# Altium footprint library 集大电协1.5.PcbLib: 283 footprints (part 4 of 18)
Each footprint in its own frame and in the unit in brackets; x right, y up, seen from the top. Pads: shape width x height; smd on the part's side, far side on the other; paste and mask are expansions set on the pad; w line width, h text height; cw(c..) or ccw(c..) is an arc to the next point about the centre after c.
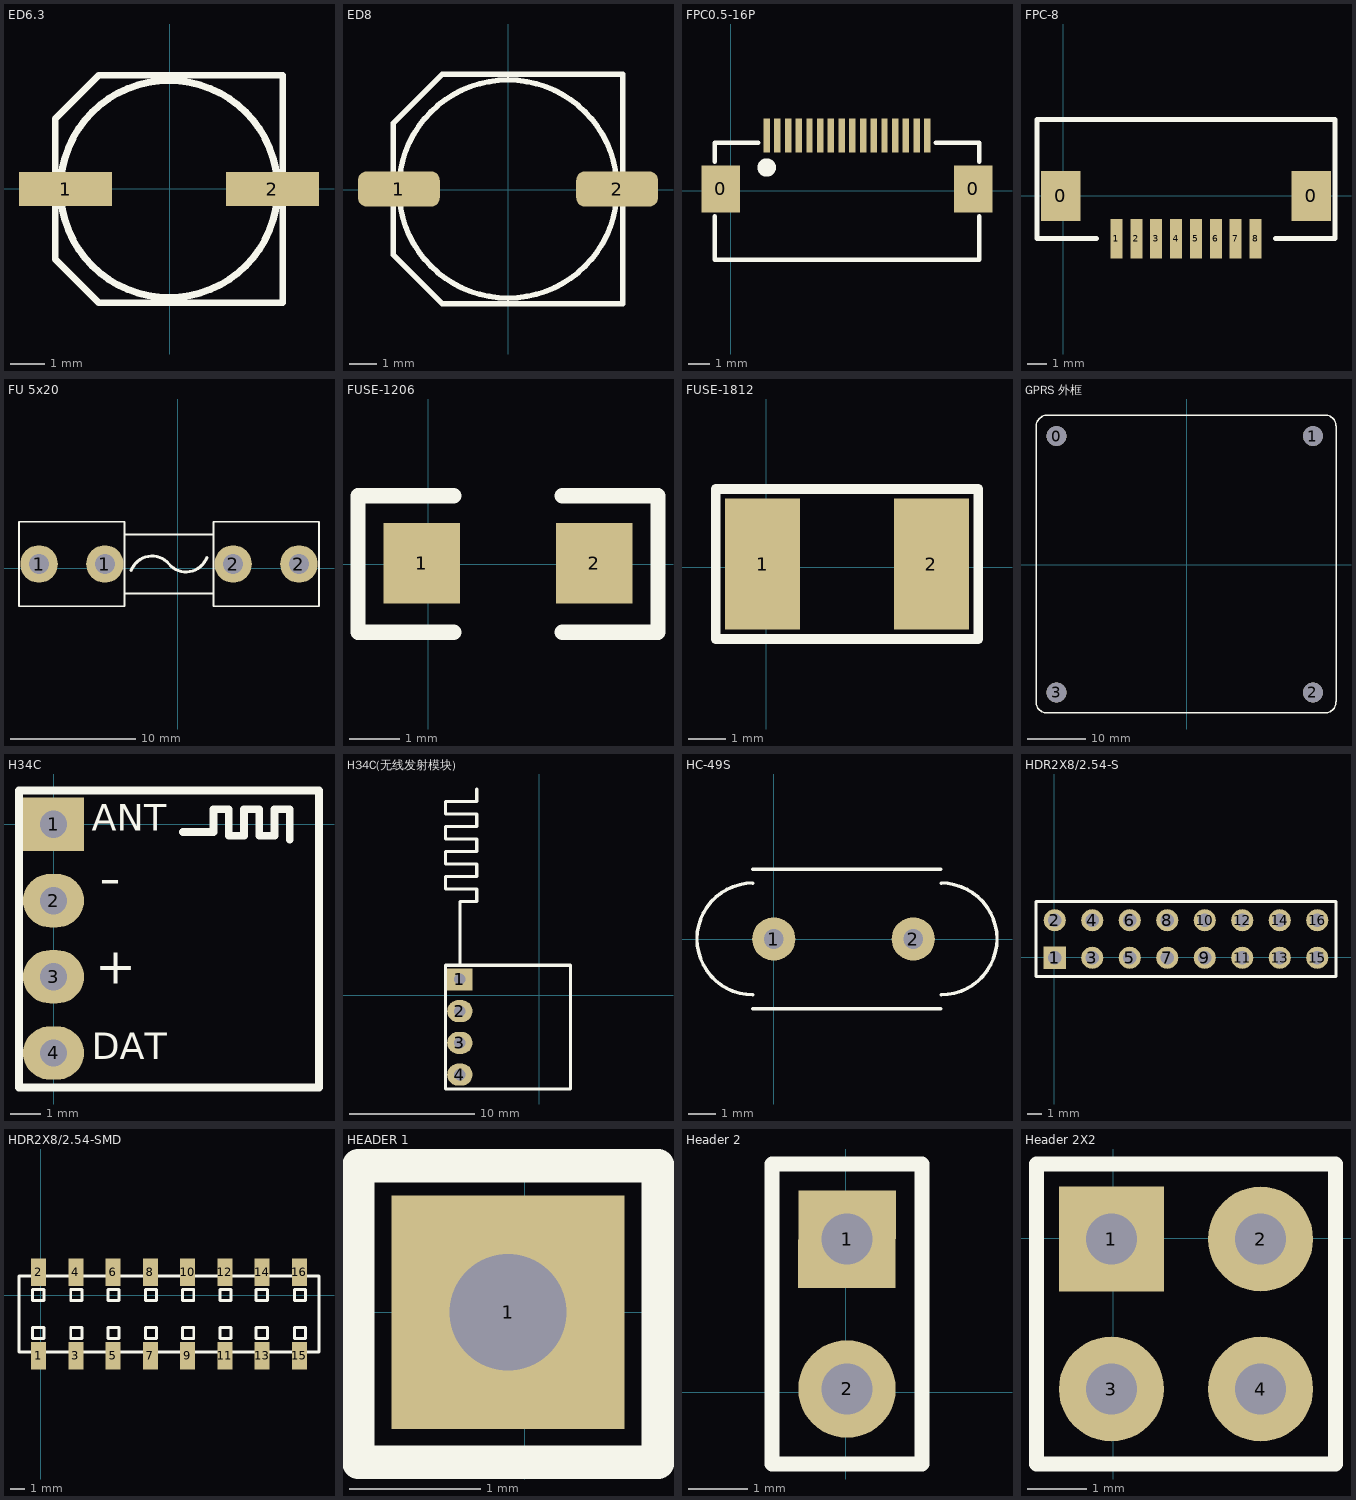
[diagram p3: the footprints below, top view; thin cyan lines are the x and y axes]

## ED6.3 [mm]
pads (2):
  rect 2.7x1 smd: 1(-3.015,-0.003) 2(2.985,-0.003)
Top Overlay:
  circle w0.2: c-0.015,-0.003 r3.15
  lines w0.2: -3.315,2.029 -3.315,-2.035 -2.047,-3.303 3.285,-3.303 3.285,3.297 -2.047,3.297 -3.303,2.042
3D body "SL-E.step": height 5.2, standoff 0, extent -3.515,-3.305 3.485,3.295

## ED8 [mm]
pads (2):
  rrect50% 3x1.3 smd: 1(-4.005,0.028) 2(3.995,0.028)
Top Overlay:
  circle w0.2: c-0.005,0.028 r4
  lines w0.2: -4.205,-2.385 -4.205,2.441 -2.418,4.228 4.195,4.228 4.195,-4.172 -2.418,-4.172 -4.205,-2.385
3D body "SL-H.step": height 10.5, standoff 0, extent -4.526,-4.188 4.474,4.112

## FPC0.5-16P [mm]
pads (18):
  rect 1.8x2.2 smd: 0(-0.47,0.08) 0(11.33,0.08)
  rect 0.3x1.6 smd: 1(1.68,2.577) 2(2.18,2.577) 3(2.68,2.577) 4(3.18,2.577) 5(3.68,2.577) 6(4.18,2.577) 7(4.68,2.577) 8(5.18,2.577) 9(5.68,2.577) 10(6.18,2.577) 11(6.68,2.577) 12(7.18,2.577) 13(7.68,2.577) 14(8.18,2.577) 15(8.68,2.577) 16(9.18,2.577)
Top Overlay:
  circle w0.5: c1.68,1.08 r0.18
  lines w0.2: -0.745,-1.19 -0.745,-3.222 11.605,-3.222 11.605,-1.19 ; -0.745,1.35 -0.745,2.239 1.287,2.239 ; 9.573,2.239 11.605,2.239 11.605,1.35
3D body "FPC0.5-16P.STEP": height 2, standoff -0.01, extent -0.67,-3.151 11.53,2.849

## FPC-8 [mm]
pads (10):
  rect 2x2.5 smd: 0(-0.133,-0.009) 0(12.467,-0.009)
  rect 0.6x2 smd: 1(2.667,-2.159) 2(3.667,-2.159) 3(4.667,-2.159) 4(5.667,-2.159) 5(6.667,-2.159) 6(7.667,-2.159) 7(8.667,-2.159) 8(9.667,-2.159)
Top Overlay:
  lines w0.254: 1.667,-2.159 -1.333,-2.159 -1.333,3.841 13.667,3.841 13.667,-2.159 10.667,-2.159

## FU 5x20 [mm] "5*20保险管底座夹子"
pads (4):
  round 3 hole 1.6: 1(-11.086,0.33) 1(-5.816,0.33) 2(4.444,0.33) 2(9.714,0.33)
Top Overlay:
  lines w0.15: -4.242,-2.02 2.87,-2.02 ; -4.242,2.68 2.87,2.68 ; -12.686,-3.05 -12.686,3.71 -4.242,3.71 -4.242,-3.05 -12.686,-3.05 ; 2.87,-3.05 2.87,3.71 11.314,3.71 11.314,-3.05 2.87,-3.05
  lines w0.254: -3.713,-0.19 cw(c-2.048,-0.813) -0.686,0.33 ccw(c0.676,1.473) 2.341,0.85
3D body "FU 5x20.STEP": height 9.77, standoff -3.6, extent -11.486,-2.82 10.114,3.48

## FUSE-1206 [mm]
pads (2):
  rect 1.524x1.6 smd: 1(-0.13,0.019) 2(3.299,0.019)
Top Overlay:
  lines w0.305: 0.505,-1.353 -1.4,-1.353 -1.4,1.365 0.505,1.365 ; 2.664,-1.353 4.569,-1.353 4.569,1.365 2.664,1.365
3D body "9.STEP": height 0.87, standoff 0, extent -0.25,-0.775 2.95,0.845

## FUSE-1812 [mm]
pads (2):
  rect 2x3.5 smd: 1(-0.1,0.086) 2(4.4,0.086)
Top Overlay:
  lines w0.254: -1.35,-1.914 -1.35,2.086 5.65,2.086 5.65,-1.914 -1.35,-1.914
3D body "User Library-fuse1812.STEP": height 1.32, standoff 0, extent -0.26,-1.524 4.56,1.696

## GPRS 外框 [mm]
pads (4):
  round 3.45 hole 3.42: 0(-22.466,22.203) 1(21.73,22.203) 2(21.73,-21.993) 3(-22.466,-21.993)
Top Overlay:
  lines w0.254: -26,-23.6 ccw(c-24.1,-23.6) -24.1,-25.5 23.8,-25.5 ccw(c23.8,-23.6) 25.7,-23.6 25.7,23.952 ccw(c23.852,23.952) 23.852,25.8 -24,25.8 ccw(c-24,23.8) -26,23.8 -26,-23.6
3D body: height 10, standoff 8, extent -25.857,-25.629 25.806,25.781
3D body: height 8, standoff 0, extent -24.111,-23.717 -20.715,-20.319
3D body: height 8, standoff 0, extent 20.085,-23.717 23.481,-20.319
3D body: height 8, standoff 0, extent 19.984,20.505 23.379,23.902
3D body: height 8, standoff 0, extent -24.162,20.505 -20.766,23.902

## H34C [mil]
pads (4):
  rect 80x70 hole 36: 1(0,0)
  oval 80x70 hole 36: 2(0,-100) 3(0,-200) 4(0,-300)
Top Overlay:
  lines w10: 170,-10 210,-10 210,20 230,20 230,-15 250,-15 250,20 270,20 270,-15 290,-15 290,20 310,20 310,-10 310,-20 ; -45.28,-345.28 348.43,-345.28 348.43,44.49 84.65,44.49 -45.28,44.49 -45.28,-345.28
  text "ANT" at 50,-20 h60
  text "-" at 60,-115 h100
  text "+" at 55,-225 h80
  text "DAT" at 50,-320 h60
3D body "HDR1X4_2.54mm.STEP": height 336.22, standoff -118.11, extent -50,-350 50,50
3D body: height 40, standoff 30, extent 175,-300 275,0
3D body: height 30, standoff 0, extent -40,-340 345,40

## H34C(无线发射模块) [mil]
pads (4):
  rect 80x70 hole 36: 1(-250,50)
  oval 80x70 hole 36: 2(-250,-50) 3(-250,-150) 4(-250,-250)
Top Overlay:
  lines w10: -250,94.49 -250,295.28 -196.85,295.28 -196.85,334.65 -295.28,334.65 -295.28,374.02 -196.85,374.02 -196.85,413.39 -295.28,413.39 -295.28,452.76 -196.85,452.76 -196.85,492.13 -295.28,492.13 -295.28,531.5 -196.85,531.5 -196.85,570.87 -295.28,570.87 -295.28,610.24 -196.85,610.24 -196.85,649.61 ; -295.28,-295.28 -295.28,94.49 -165.35,94.49 98.43,94.49 98.43,-295.28 -295.28,-295.28

## HC-49S [mil]
pads (2):
  round 62 hole 28: 1(0,0) 2(200,0)
Top Overlay:
  lines w5: -30,-100.31 239.69,-100.31 ; -30,-80 cw(c-30,0.16) -30,80.31 ; -30,100.31 239.69,100.31 ; 240,-80 ccw(c240,0.16) 240,80.31
3D body "XTAL.STEP": height 142.73, standoff -77.74, extent -113.55,-101.53 326.32,82.43

## HDR2X8/2.54-S [mm]
pads (16):
  rect 1.5x1.5 hole 0.9: 1(0.039,-0.02)
  round 1.5 hole 0.9: 2(0.039,2.52) 3(2.579,-0.02) 4(2.579,2.52) 5(5.119,-0.02) 6(5.119,2.52) 7(7.659,-0.02) 8(7.659,2.52) 9(10.199,-0.02) 10(10.199,2.52) 11(12.739,-0.02) 12(12.739,2.52) 13(15.279,-0.02) 14(15.279,2.52) 15(17.819,-0.02) 16(17.819,2.52)
Top Overlay:
  lines w0.2: -1.231,-1.29 -1.231,3.79 19.089,3.79 19.089,-1.29 -1.231,-1.29
3D body "Female-Header-2.54-Double-16.stp": height 8.5, standoff -3.2, extent -1.356,-1.25 19.214,3.75

## HDR2X8/2.54-SMD [mm]
pads (16):
  rect 1.02x1.9 smd: 1(-0.146,-4.117) 2(-0.146,1.583) 3(2.394,-4.117) 4(2.394,1.583) 5(4.934,-4.117) 6(4.934,1.583) 7(7.474,-4.117) 8(7.474,1.583) 9(10.014,-4.117) 10(10.014,1.583) 11(12.554,-4.117) 12(12.554,1.583) 13(15.094,-4.117) 14(15.094,1.583) 15(17.634,-4.117) 16(17.634,1.583)
Top Overlay:
  lines w0.2: -1.486,-3.867 -1.486,1.333 18.964,1.333 18.964,-3.867 -1.486,-3.867 ; -0.557,-2.948 -0.557,-2.186 0.205,-2.186 0.205,-2.948 -0.557,-2.948 ; -0.557,-0.348 -0.557,0.414 0.205,0.414 0.205,-0.348 -0.557,-0.348 ; 2.043,-2.948 2.043,-2.186 2.805,-2.186 2.805,-2.948 2.043,-2.948 ; 2.043,-0.348 2.043,0.414 2.805,0.414 2.805,-0.348 2.043,-0.348 ; 4.583,-2.948 5.345,-2.948 5.345,-2.186 4.583,-2.186 4.583,-2.948 ; 4.583,-0.348 5.345,-0.348 5.345,0.414 4.583,0.414 4.583,-0.348 ; 7.123,-2.948 7.123,-2.186 7.885,-2.186 7.885,-2.948 7.123,-2.948 ; 7.123,-0.348 7.123,0.414 7.885,0.414 7.885,-0.348 7.123,-0.348 ; 9.663,-2.948 9.663,-2.186 10.425,-2.186 10.425,-2.948 9.663,-2.948 ; 9.663,-0.348 9.663,0.414 10.425,0.414 10.425,-0.348 9.663,-0.348 ; 12.203,-2.948 12.203,-2.186 12.965,-2.186 12.965,-2.948 12.203,-2.948 ; 12.203,-0.348 12.203,0.414 12.965,0.414 12.965,-0.348 12.203,-0.348 ; 14.683,-2.948 15.445,-2.948 15.445,-2.186 14.683,-2.186 14.683,-2.948 ; 14.683,-0.348 15.445,-0.348 15.445,0.414 14.683,0.414 14.683,-0.348 ; 17.283,-2.948 18.045,-2.948 18.045,-2.186 17.283,-2.186 17.283,-2.948 ; 17.283,-0.348 18.045,-0.348 18.045,0.414 17.283,0.414 17.283,-0.348
3D body "Fe-Header2X1.STEP": height 5.15, standoff 0, extent 13.764,-4.365 16.364,2.035
3D body "Fe-Header2X1.STEP": height 5.15, standoff 0, extent 11.224,-4.365 13.824,2.035
3D body "Fe-Header2X1.STEP": height 5.15, standoff 0, extent 6.144,-4.365 8.744,2.035
3D body "Fe-Header2X1.STEP": height 5.15, standoff 0, extent 8.684,-4.365 11.284,2.035
3D body "Fe-Header2X1.STEP": height 5.15, standoff 0, extent -1.476,-4.365 1.124,2.035
3D body "Fe-Header2X1.STEP": height 5.15, standoff 0, extent 1.064,-4.365 3.664,2.035
3D body "Fe-Header2X1.STEP": height 5.15, standoff 0, extent 3.604,-4.365 6.204,2.035
3D body "Fe-Header2X1.STEP": height 5.15, standoff 0, extent 16.304,-4.365 18.904,2.035

## HEADER 1 [mil]
pads (1):
  rect 70x70 hole 35: 1(-5,0)
Top Overlay:
  lines w10: -50,-45 40,-45 40,44 12,44 -22,44 -50,44 -50,-45

## Header 2 [mil]
pads (2):
  rect 65x65 hole 34: 1(0.81,102.01)
  round 65 hole 34: 2(0.81,2.01)
Top Overlay:
  lines w10: -49.19,-47.99 50.81,-47.99 50.81,152.01 -49.19,152.01 -49.19,-47.99
3D body: height 336.22, standoff -118.11, extent -50,-50.39 50,149.61

## Header 2X2 [mil]
pads (4):
  rect 70x70 hole 34: 1(-1.16,-0.35)
  round 70 hole 34: 2(98.25,-0.35) 3(-1.16,-100.35) 4(98.25,-100.35)
Top Overlay:
  lines w10: 48.25,-150.35 148.25,-150.35 148.25,49.65 48.25,49.65 ; 48.84,-150.35 -51.16,-150.35 -51.16,49.65 48.84,49.65
3D body: height 336.22, standoff -118.11, extent 47.44,-152.76 147.44,47.24
3D body: height 336.22, standoff -118.11, extent -51.97,-152.76 48.03,47.24